# Altium footprint library pcb_Active.PcbLib: 86 footprints (part 6 of 6)
Each footprint in its own frame and in the unit in brackets; x right, y up, seen from the top. Pads: shape width x height; smd on the part's side, far side on the other; paste and mask are expansions set on the pad; w line width, h text height; cw(c..) or ccw(c..) is an arc to the next point about the centre after c.
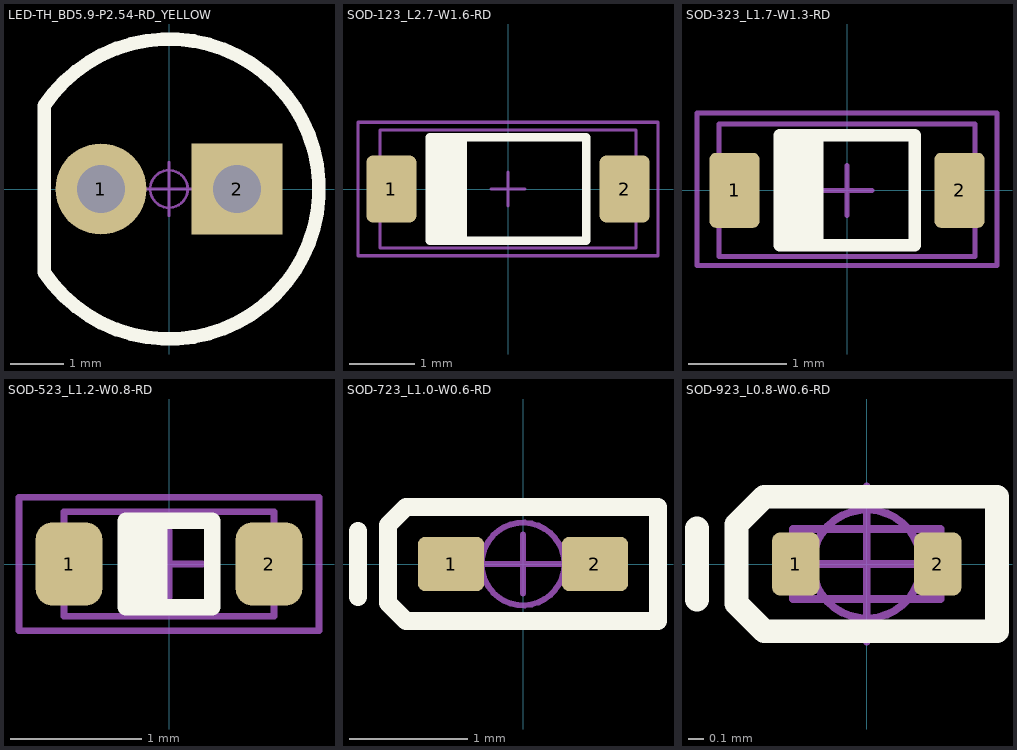
[diagram p5: the footprints below, top view; thin cyan lines are the x and y axes]

## LED-TH_BD5.9-P2.54-RD_YELLOW [mm] "黄色5mm直插LED"
pads (2):
  round 1.7 hole 0.9: 1(-1.27,0)
  rect 1.7x1.7 hole 0.9: 2(1.27,0)
Top Overlay:
  lines w0.254: -2.33,-1.553 ccw(c0,0) -2.33,1.553 -2.33,-1.553
Mechanical 15:
  circle w0.05: c0,0 r0.35
  lines w0.05: -0.5,0 0.5,0 ; 0,-0.5 0,0.5
Mechanical 16:
  text ".Designator" at 0,0 h1
3D body "LED 5mm-Y.STEP": height 4.5, standoff -3.45, extent -2.076,-0.8 1.983,0.79
3D body "LED 5mm玻璃罩.STEP": height 8.75, standoff 0.05, extent -2.454,-2.841 2.85,2.841

## SOD-123_L2.7-W1.6-RD [mil]
height 45.28
pads (2):
  rrect25% 30x40 smd: 1(-70,0) 2(70,0)
Top Overlay:
  region: -47,-31 -47,31 -27,31 -27,-31
  lines w5: -27,-31 -27,31 ; -47,-31 -47,31 47,31 47,-31 -47,-31
Mechanical 13:
  lines w2: -9.99,0 10.01,0 ; 0.01,-10 0.01,10 ; -76.77,-35.43 -76.77,35.43 76.78,35.43 76.78,-35.43 -76.77,-35.43
Mechanical 14:
  lines w2: -90,-40 90,-40 90,40 -90,40 -90,-40
Mechanical 16:
  text ".Designator" at 0,0 h39.37
3D body "User Library-SOD123-1.STEP": height 46.46, standoff 0, extent -76.77,-35.43 76.78,35.43

## SOD-323_L1.7-W1.3-RD [mil]
height 45.28
pads (2):
  rrect25% 20x30 smd mask+2: 1(-45,0) 2(45,0)
Top Overlay:
  region: -12,-22 -27,-22 -27,22 -12,22
  lines w5: -12,-22 -12,22 ; -27,-22 -27,22 27,22 27,-22 -27,-22
Mechanical 13:
  lines w2: -10,0 10,0 ; 0,-10 0,10 ; -51.18,-26.58 51.18,-26.58 51.18,26.58 -51.18,26.58 -51.18,-26.58
Mechanical 14:
  lines w2: -60,-30 -60,31 60,31 60,-30 -60,-30
Mechanical 16:
  text ".Designator" at 0,0 h39.37
3D body "SOD323.STEP": height 43.31, standoff 0, extent -51.18,-26.58 51.18,26.57

## SOD-523_L1.2-W0.8-RD [mil]
height 45.28
pads (2):
  rrect50% 20x25 smd: 1(-30,0) 2(30,0)
Top Overlay:
  region: -3,-13 -13,-13 -13,13 -3,13
  lines w5: -3,-13 -3,13 ; -13,-13 13,-13 13,13 -13,13 -13,-13
Mechanical 13:
  lines w2: -10,0 10,0 ; 0,-10 0,10 ; -31.5,-15.7 -31.5,15.7 31.5,15.7 31.5,-15.7 -31.5,-15.7
Mechanical 14:
  lines w2: -45,-20 -45,20 45,20 45,-20 -45,-20
Mechanical 16:
  text ".Designator" at 0,0 h39.37
3D body "User Library-SOD-523F.STEP": height 27.56, standoff 0, extent -31.5,-15.7 31.49,15.69

## SOD-723_L1.0-W0.6-RD [mil] "1x0.6X0.5mm"
pads (2):
  rrect25% 22x18 smd: 1(-24,0) 2(24,0)
Top Overlay:
  lines w6: -55,-11 -55,11 ; -45,-13 -39,-19 45,-19 45,19 -39,19 -45,13 -45,-13
Mechanical 15:
  circle w1.97: c0,0 r13.78
  lines w1.97: -19.68,0 19.68,0 ; 0,-9.84 0,9.84
Mechanical 16:
  text ".Designator" at 0,0 h39.37
3D body "SOD-723.STEP": height 20.87, standoff 1.06, extent -27.56,-11.81 27.56,11.81

## SOD-923_L0.8-W0.6-RD [mil] "0.8x0.6X0.4mm（长宽高，不包括引脚）"
pads (2):
  rrect36% 12x16 smd mask+3: 1(-18,0) 2(18,0)
Top Overlay:
  lines w6: -43,-9 -43,9 ; -33,-10 -33,10 -26,17 33,17 33,-17 -26,-17 -33,-10
Mechanical 11:
  lines w2.01: -18.7,-8.86 -18.7,8.86 18.7,8.86 18.7,-8.86 -18.7,-8.86
Mechanical 15:
  circle w1.97: c0,0 r13.78
  lines w1.97: -19.68,0 19.68,0 ; 0,-19.68 0,19.68
Mechanical 16:
  text ".Designator" at 0,0 h39.37
3D body "SOD-923.STEP": height 16.93, standoff 1.06, extent -19.68,-11.81 19.68,11.81